# Altium footprint library Z566M.PcbLib: 1 footprints
Each footprint in its own frame and in the unit in brackets; x right, y up, seen from the top. Pads: shape width x height; smd on the part's side, far side on the other; paste and mask are expansions set on the pad; w line width, h text height; cw(c..) or ccw(c..) is an arc to the next point about the centre after c.
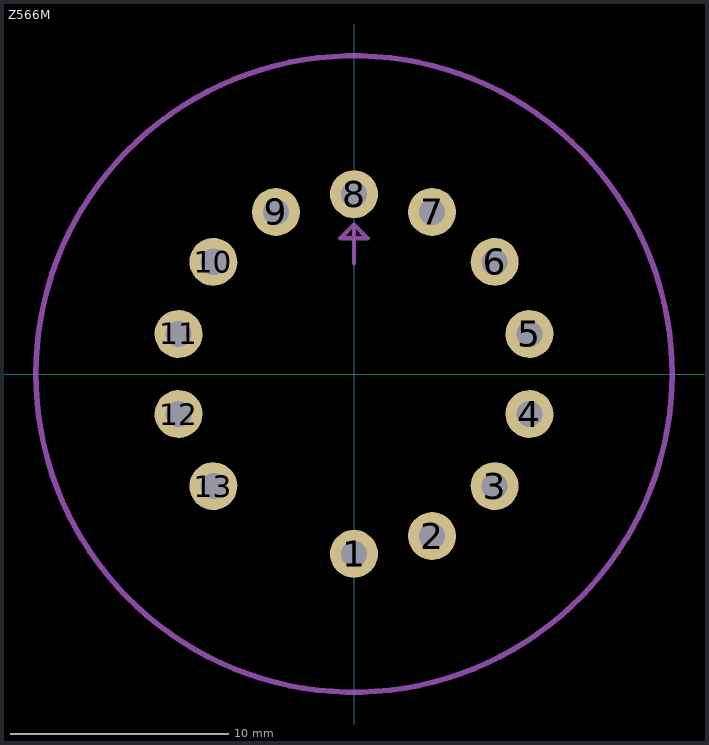
[diagram p0: the footprint, top view; thin cyan lines are the x and y axes]

## Z566M [mm] "Z566M Nixie Tube"
height 69.012
pads (13):
  round 2.2 hole 1.2: 1(0,-8.255) 2(3.582,-7.438) 3(6.454,-5.147) 4(8.048,-1.837) 5(8.048,1.837) 6(6.454,5.147) 7(3.582,7.437) 8(0,8.255) 9(-3.581,7.438) 10(-6.454,5.147) 11(-8.048,1.837) 12(-8.048,-1.836) 13(-6.454,-5.147)
Mechanical 2:
  circle w0.254: c0,0 r14.6
  lines w0.2: 0,5.08 0,6.858 ; 0,6.858 0.635,6.223 -0.635,6.223 0,6.858
  text "Front" at -3.175,3.175 h1.52
3D body: height 0.4, standoff -4.3, extent -7,-5.695 -5.904,-4.597
3D body: height 11.8, standoff 0.3, extent -7.198,-5.895 -5.704,-4.398
3D body: height 0.4, standoff -4.3, extent -8.594,-2.385 -7.498,-1.287
3D body: height 11.8, standoff 0.3, extent -8.792,-2.585 -7.298,-1.088
3D body: height 0.4, standoff -4.3, extent -8.593,1.289 -7.498,2.386
3D body: height 11.8, standoff 0.3, extent -8.792,1.089 -7.298,2.586
3D body: height 0.4, standoff -4.3, extent -6.999,4.598 -5.904,5.696
3D body: height 11.8, standoff 0.3, extent -7.198,4.399 -5.704,5.896
3D body: height 0.4, standoff -4.3, extent -4.127,6.889 -3.031,7.987
3D body: height 11.8, standoff 0.3, extent -4.325,6.689 -2.831,8.186
3D body: height 0.4, standoff -4.3, extent -0.545,7.706 0.55,8.804
3D body: height 11.8, standoff 0.3, extent -0.744,7.507 0.75,9.004
3D body: height 0.4, standoff -4.3, extent 3.036,6.889 4.132,7.986
3D body: height 11.8, standoff 0.3, extent 2.838,6.689 4.332,8.186
3D body: height 0.4, standoff -4.3, extent 5.909,4.598 7.004,5.696
3D body: height 11.8, standoff 0.3, extent 5.71,4.398 7.204,5.895
3D body: height 0.4, standoff -4.3, extent 7.503,1.288 8.598,2.386
3D body: height 11.8, standoff 0.3, extent 7.304,1.088 8.798,2.585
3D body: height 0.4, standoff -4.3, extent 7.503,-2.386 8.598,-1.288
3D body: height 11.8, standoff 0.3, extent 7.304,-2.585 8.798,-1.088
3D body: height 0.4, standoff -4.3, extent 5.908,-5.696 7.004,-4.598
3D body: height 11.8, standoff 0.3, extent 5.71,-5.895 7.204,-4.398
3D body: height 0.4, standoff -4.3, extent 3.036,-7.986 4.132,-6.888
3D body: height 11.8, standoff 0.3, extent 2.838,-8.186 4.332,-6.689
3D body: height 0.4, standoff -4.3, extent -0.545,-8.804 0.55,-7.706
3D body: height 11.8, standoff 0.3, extent -0.744,-9.003 0.75,-7.506
3D body "Z566M.step": height 72.5, standoff 5.5, extent -14.256,-14.256 14.256,14.256